# Altium footprint library Molex FFC - FPC Connectors (SMT).PcbLib: 638 footprints (part 19 of 40)
Each footprint in its own frame and in the unit in brackets; x right, y up, seen from the top. Pads: shape width x height; smd on the part's side, far side on the other; paste and mask are expansions set on the pad; w line width, h text height; cw(c..) or ccw(c..) is an arc to the next point about the centre after c.
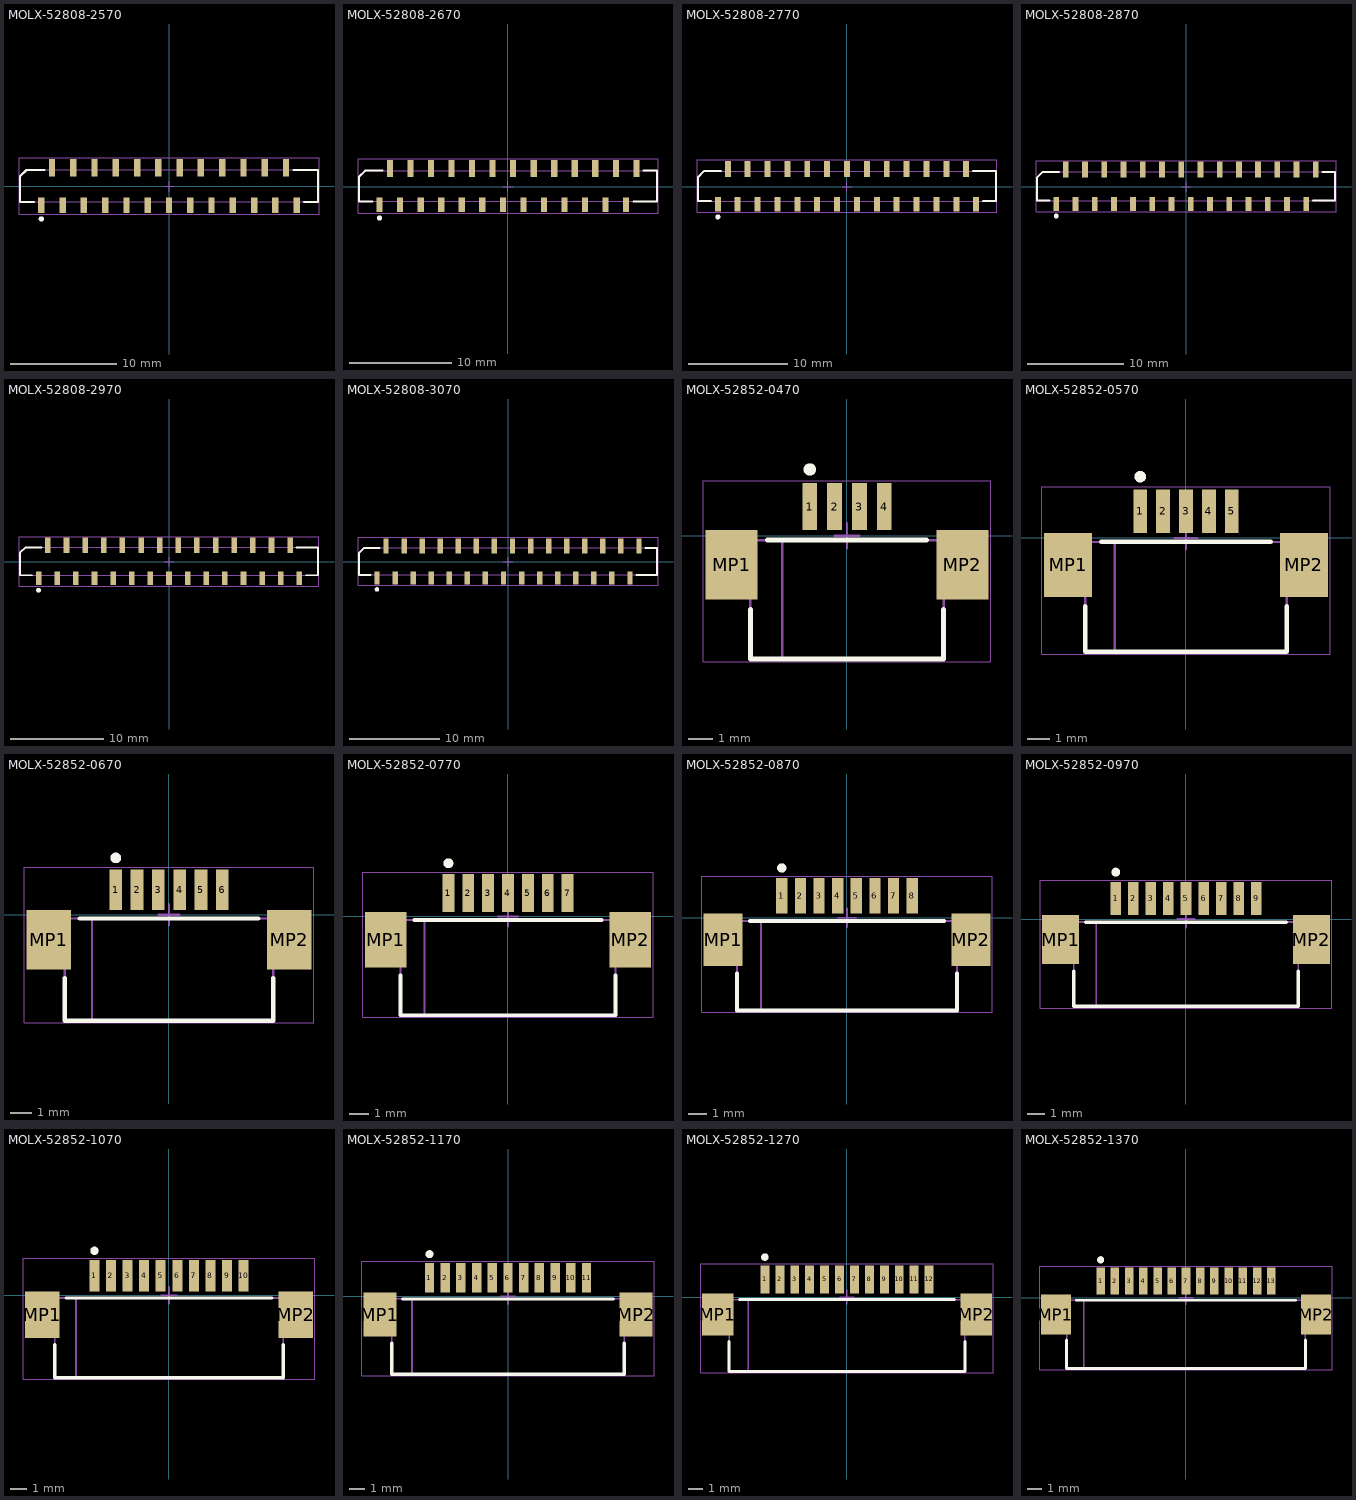
[diagram p18: the footprints below, top view; thin cyan lines are the x and y axes]

## MOLX-52808-2570 [mm] "FFC Connector, 25-Leads, Vertical, Pitch 1.0 mm, Mated Height 5.05 mm, SMT"
height 5.112
pads (25):
  rect 0.6x1.45 smd: 1(-12,-1.775) 3(-10,-1.775) 5(-8,-1.775) 7(-6,-1.775) 9(-4,-1.775) 11(-2,-1.775) 13(0,-1.775) 15(2,-1.775) 17(4,-1.775) 19(6,-1.775) 21(8,-1.775) 23(10,-1.775) 25(12,-1.775)
  rect 0.6x1.65 smd: 2(-11,1.775) 4(-9,1.775) 6(-7,1.775) 8(-5,1.775) 10(-3,1.775) 12(-1,1.775) 14(1,1.775) 16(3,1.775) 18(5,1.775) 20(7,1.775) 22(9,1.775) 24(11,1.775)
Top Overlay:
  circle w0.25: c-12,-3.05 r0.125
  lines w0.2: -12.7,-1.45 -14,-1.45 -14,0.95 -13.4,1.55 -11.7,1.55 ; 11.7,1.55 14,1.55 14,-1.45 12.7,-1.45
Mechanical 13:
  lines w0.1: -14,-1.45 14,-1.45 14,1.55 -13.4,1.55 -14,0.95 -14,-1.45
Mechanical 15:
  lines w0.05: -14.1,-2.6 14.1,-2.6 14.1,2.7 -14.1,2.7 -14.1,-2.6
  lines w0.1: -0.5,0 0.5,0 ; 0,-0.5 0,0.5
3D body: height 0.25, standoff 0, extent -14,-2.2 14,2.3

## MOLX-52808-2670 [mm] "FFC Connector, 26-Leads, Vertical, Pitch 1.0 mm, Mated Height 5.05 mm, SMT"
height 5.112
pads (26):
  rect 0.6x1.45 smd: 1(-12.5,-1.775) 3(-10.5,-1.775) 5(-8.5,-1.775) 7(-6.5,-1.775) 9(-4.5,-1.775) 11(-2.5,-1.775) 13(-0.5,-1.775) 15(1.5,-1.775) 17(3.5,-1.775) 19(5.5,-1.775) 21(7.5,-1.775) 23(9.5,-1.775) 25(11.5,-1.775)
  rect 0.6x1.65 smd: 2(-11.5,1.775) 4(-9.5,1.775) 6(-7.5,1.775) 8(-5.5,1.775) 10(-3.5,1.775) 12(-1.5,1.775) 14(0.5,1.775) 16(2.5,1.775) 18(4.5,1.775) 20(6.5,1.775) 22(8.5,1.775) 24(10.5,1.775) 26(12.5,1.775)
Top Overlay:
  circle w0.25: c-12.5,-3.05 r0.125
  lines w0.2: -13.2,-1.45 -14.5,-1.45 -14.5,0.95 -13.9,1.55 -12.2,1.55 ; 12.2,-1.45 14.5,-1.45 14.5,1.55 13.2,1.55
Mechanical 13:
  lines w0.1: -14.5,-1.45 14.5,-1.45 14.5,1.55 -13.9,1.55 -14.5,0.95 -14.5,-1.45
Mechanical 15:
  lines w0.05: -14.6,-2.6 14.6,-2.6 14.6,2.7 -14.6,2.7 -14.6,-2.6
  lines w0.1: -0.5,0 0.5,0 ; 0,-0.5 0,0.5
3D body: height 0.25, standoff 0, extent -14.5,-2.2 14.5,2.3

## MOLX-52808-2770 [mm] "FFC Connector, 27-Leads, Vertical, Pitch 1.0 mm, Mated Height 5.05 mm, SMT"
height 5.112
pads (27):
  rect 0.6x1.45 smd: 1(-13,-1.775) 3(-11,-1.775) 5(-9,-1.775) 7(-7,-1.775) 9(-5,-1.775) 11(-3,-1.775) 13(-1,-1.775) 15(1,-1.775) 17(3,-1.775) 19(5,-1.775) 21(7,-1.775) 23(9,-1.775) 25(11,-1.775) 27(13,-1.775)
  rect 0.6x1.65 smd: 2(-12,1.775) 4(-10,1.775) 6(-8,1.775) 8(-6,1.775) 10(-4,1.775) 12(-2,1.775) 14(0,1.775) 16(2,1.775) 18(4,1.775) 20(6,1.775) 22(8,1.775) 24(10,1.775) 26(12,1.775)
Top Overlay:
  circle w0.25: c-13,-3.05 r0.125
  lines w0.2: -13.7,-1.45 -15,-1.45 -15,0.95 -14.4,1.55 -12.7,1.55 ; 12.7,1.55 15,1.55 15,-1.45 13.7,-1.45
Mechanical 13:
  lines w0.1: -15,-1.45 15,-1.45 15,1.55 -14.4,1.55 -15,0.95 -15,-1.45
Mechanical 15:
  lines w0.05: -15.1,-2.6 15.1,-2.6 15.1,2.7 -15.1,2.7 -15.1,-2.6
  lines w0.1: -0.5,0 0.5,0 ; 0,-0.5 0,0.5
3D body: height 0.25, standoff 0, extent -15,-2.2 15,2.3

## MOLX-52808-2870 [mm] "FFC Connector, 28-Leads, Vertical, Pitch 1.0 mm, Mated Height 5.05 mm, SMT"
height 5.112
pads (28):
  rect 0.6x1.45 smd: 1(-13.5,-1.775) 3(-11.5,-1.775) 5(-9.5,-1.775) 7(-7.5,-1.775) 9(-5.5,-1.775) 11(-3.5,-1.775) 13(-1.5,-1.775) 15(0.5,-1.775) 17(2.5,-1.775) 19(4.5,-1.775) 21(6.5,-1.775) 23(8.5,-1.775) 25(10.5,-1.775) 27(12.5,-1.775)
  rect 0.6x1.65 smd: 2(-12.5,1.775) 4(-10.5,1.775) 6(-8.5,1.775) 8(-6.5,1.775) 10(-4.5,1.775) 12(-2.5,1.775) 14(-0.5,1.775) 16(1.5,1.775) 18(3.5,1.775) 20(5.5,1.775) 22(7.5,1.775) 24(9.5,1.775) 26(11.5,1.775) 28(13.5,1.775)
Top Overlay:
  circle w0.25: c-13.5,-3.05 r0.125
  lines w0.2: -14.2,-1.45 -15.5,-1.45 -15.5,0.95 -14.9,1.55 -13.2,1.55 ; 13.2,-1.45 15.5,-1.45 15.5,1.55 14.2,1.55
Mechanical 13:
  lines w0.1: -15.5,-1.45 15.5,-1.45 15.5,1.55 -14.9,1.55 -15.5,0.95 -15.5,-1.45
Mechanical 15:
  lines w0.05: -15.6,-2.6 15.6,-2.6 15.6,2.7 -15.6,2.7 -15.6,-2.6
  lines w0.1: -0.5,0 0.5,0 ; 0,-0.5 0,0.5
3D body: height 0.25, standoff 0, extent -15.5,-2.2 15.5,2.3

## MOLX-52808-2970 [mm] "FFC Connector, 29-Leads, Vertical, Pitch 1.0 mm, Mated Height 5.05 mm, SMT"
height 5.112
pads (29):
  rect 0.6x1.45 smd: 1(-14,-1.775) 3(-12,-1.775) 5(-10,-1.775) 7(-8,-1.775) 9(-6,-1.775) 11(-4,-1.775) 13(-2,-1.775) 15(0,-1.775) 17(2,-1.775) 19(4,-1.775) 21(6,-1.775) 23(8,-1.775) 25(10,-1.775) 27(12,-1.775) 29(14,-1.775)
  rect 0.6x1.65 smd: 2(-13,1.775) 4(-11,1.775) 6(-9,1.775) 8(-7,1.775) 10(-5,1.775) 12(-3,1.775) 14(-1,1.775) 16(1,1.775) 18(3,1.775) 20(5,1.775) 22(7,1.775) 24(9,1.775) 26(11,1.775) 28(13,1.775)
Top Overlay:
  circle w0.25: c-14,-3.05 r0.125
  lines w0.2: -14.7,-1.45 -16,-1.45 -16,0.95 -15.4,1.55 -13.7,1.55 ; 13.7,1.55 16,1.55 16,-1.45 14.7,-1.45
Mechanical 13:
  lines w0.1: -16,-1.45 16,-1.45 16,1.55 -15.4,1.55 -16,0.95 -16,-1.45
Mechanical 15:
  lines w0.05: -16.1,-2.6 16.1,-2.6 16.1,2.7 -16.1,2.7 -16.1,-2.6
  lines w0.1: -0.5,0 0.5,0 ; 0,-0.5 0,0.5
3D body: height 0.25, standoff 0, extent -16,-2.2 16,2.3

## MOLX-52808-3070 [mm] "FFC Connector, 30-Leads, Vertical, Pitch 1.0 mm, Mated Height 5.05 mm, SMT"
height 5.112
pads (30):
  rect 0.6x1.45 smd: 1(-14.5,-1.775) 3(-12.5,-1.775) 5(-10.5,-1.775) 7(-8.5,-1.775) 9(-6.5,-1.775) 11(-4.5,-1.775) 13(-2.5,-1.775) 15(-0.5,-1.775) 17(1.5,-1.775) 19(3.5,-1.775) 21(5.5,-1.775) 23(7.5,-1.775) 25(9.5,-1.775) 27(11.5,-1.775) 29(13.5,-1.775)
  rect 0.6x1.65 smd: 2(-13.5,1.775) 4(-11.5,1.775) 6(-9.5,1.775) 8(-7.5,1.775) 10(-5.5,1.775) 12(-3.5,1.775) 14(-1.5,1.775) 16(0.5,1.775) 18(2.5,1.775) 20(4.5,1.775) 22(6.5,1.775) 24(8.5,1.775) 26(10.5,1.775) 28(12.5,1.775) 30(14.5,1.775)
Top Overlay:
  circle w0.25: c-14.5,-3.05 r0.125
  lines w0.2: -15.2,-1.45 -16.5,-1.45 -16.5,0.95 -15.9,1.55 -14.2,1.55 ; 14.2,-1.45 16.5,-1.45 16.5,1.55 15.2,1.55
Mechanical 13:
  lines w0.1: -16.5,-1.45 16.5,-1.45 16.5,1.55 -15.9,1.55 -16.5,0.95 -16.5,-1.45
Mechanical 15:
  lines w0.05: -16.6,-2.6 16.6,-2.6 16.6,2.7 -16.6,2.7 -16.6,-2.6
  lines w0.1: -0.5,0 0.5,0 ; 0,-0.5 0,0.5
3D body: height 0.25, standoff 0, extent -16.5,-2.2 16.5,2.3

## MOLX-52852-0470 [mm] "FFC Connector, 4-Leads, Right Angle, Pitch 1.0 mm, Mated Height 3.1 mm, SMT"
height 3.1
pads (6):
  rect 0.6x1.9 smd: 1(-1.5,1.175) 2(-0.5,1.175) 3(0.5,1.175) 4(1.5,1.175)
  rect 2.1x2.8 smd: MP1(-4.65,-1.175) MP2(4.65,-1.175)
Top Overlay:
  circle w0.25: c-1.5,2.675 r0.125
  lines w0.2: -3.9,-2.975 -3.9,-4.975 3.9,-4.975 3.9,-2.975 ; -3.2,-0.175 3.2,-0.175
Mechanical 13:
  lines w0.1: -2.614,-4.975 -2.614,-0.175 ; -3.9,-4.975 -3.9,-0.175 3.9,-0.175 3.9,-4.975 -3.9,-4.975
Mechanical 15:
  lines w0.05: -5.8,-5.075 -5.8,2.225 5.8,2.225 5.8,-5.075 -5.8,-5.075
  lines w0.1: -0.5,0 0.5,0 ; 0,-0.5 0,0.5
3D body: height 0.25, standoff 0, extent -5.15,-4.975 5.15,1.825

## MOLX-52852-0570 [mm] "FFC Connector, 5-Leads, Right Angle, Pitch 1.0 mm, Mated Height 3.1 mm, SMT"
height 3.1
pads (7):
  rect 0.6x1.9 smd: 1(-2,1.175) 2(-1,1.175) 3(0,1.175) 4(1,1.175) 5(2,1.175)
  rect 2.1x2.8 smd: MP1(-5.15,-1.175) MP2(5.15,-1.175)
Top Overlay:
  circle w0.25: c-2,2.675 r0.125
  lines w0.2: -4.4,-2.975 -4.4,-4.975 4.4,-4.975 4.4,-2.975 ; -3.7,-0.175 3.7,-0.175
Mechanical 13:
  lines w0.1: -3.114,-4.975 -3.114,-0.175 ; -4.4,-4.975 4.4,-4.975 4.4,-0.175 -4.4,-0.175 -4.4,-4.975
Mechanical 15:
  lines w0.05: -6.3,-5.075 6.3,-5.075 6.3,2.225 -6.3,2.225 -6.3,-5.075
  lines w0.1: -0.5,0 0.5,0 ; 0,-0.5 0,0.5
3D body: height 0.25, standoff 0, extent -5.65,-4.975 5.65,1.825

## MOLX-52852-0670 [mm] "FFC Connector, 6-Leads, Right Angle, Pitch 1.0 mm, Mated Height 3.1 mm, SMT"
height 3.1
pads (8):
  rect 0.6x1.9 smd: 1(-2.5,1.175) 2(-1.5,1.175) 3(-0.5,1.175) 4(0.5,1.175) 5(1.5,1.175) 6(2.5,1.175)
  rect 2.1x2.8 smd: MP1(-5.65,-1.175) MP2(5.65,-1.175)
Top Overlay:
  circle w0.25: c-2.5,2.675 r0.125
  lines w0.2: -4.9,-2.975 -4.9,-4.975 4.9,-4.975 4.9,-2.975 ; -4.2,-0.175 4.2,-0.175
Mechanical 13:
  lines w0.1: -3.614,-4.975 -3.614,-0.175 ; -4.9,-4.975 4.9,-4.975 4.9,-0.175 -4.9,-0.175 -4.9,-4.975
Mechanical 15:
  lines w0.05: -6.8,-5.075 6.8,-5.075 6.8,2.225 -6.8,2.225 -6.8,-5.075
  lines w0.1: -0.5,0 0.5,0 ; 0,-0.5 0,0.5
3D body: height 0.25, standoff 0, extent -6.15,-4.975 6.15,1.825

## MOLX-52852-0770 [mm] "FFC Connector, 7-Leads, Right Angle, Pitch 1.0 mm, Mated Height 3.1 mm, SMT"
height 3.1
pads (9):
  rect 0.6x1.9 smd: 1(-3,1.175) 2(-2,1.175) 3(-1,1.175) 4(0,1.175) 5(1,1.175) 6(2,1.175) 7(3,1.175)
  rect 2.1x2.8 smd: MP1(-6.15,-1.175) MP2(6.15,-1.175)
Top Overlay:
  circle w0.25: c-3,2.675 r0.125
  lines w0.2: -5.4,-2.975 -5.4,-4.975 5.4,-4.975 5.4,-2.975 ; -4.7,-0.175 4.7,-0.175
Mechanical 13:
  lines w0.1: -4.2,-4.975 -4.2,-0.175 ; -5.4,-4.975 5.4,-4.975 5.4,-0.175 -5.4,-0.175 -5.4,-4.975
Mechanical 15:
  lines w0.05: -7.3,-5.075 7.3,-5.075 7.3,2.225 -7.3,2.225 -7.3,-5.075
  lines w0.1: -0.5,0 0.5,0 ; 0,-0.5 0,0.5
3D body: height 0.25, standoff 0, extent -6.65,-4.975 6.65,1.825

## MOLX-52852-0870 [mm] "FFC Connector, 8-Leads, Right Angle, Pitch 1.0 mm, Mated Height 3.1 mm, SMT"
height 3.1
pads (10):
  rect 0.6x1.9 smd: 1(-3.5,1.175) 2(-2.5,1.175) 3(-1.5,1.175) 4(-0.5,1.175) 5(0.5,1.175) 6(1.5,1.175) 7(2.5,1.175) 8(3.5,1.175)
  rect 2.1x2.8 smd: MP1(-6.65,-1.175) MP2(6.65,-1.175)
Top Overlay:
  circle w0.25: c-3.5,2.675 r0.125
  lines w0.2: -5.9,-2.975 -5.9,-4.975 5.9,-4.975 5.9,-2.975 ; -5.2,-0.175 5.2,-0.175
Mechanical 13:
  lines w0.1: -4.614,-4.975 -4.614,-0.175 ; -5.9,-4.975 -5.9,-0.175 5.9,-0.175 5.9,-4.975 -5.9,-4.975
Mechanical 15:
  lines w0.05: -7.8,-5.075 -7.8,2.225 7.8,2.225 7.8,-5.075 -7.8,-5.075
  lines w0.1: -0.5,0 0.5,0 ; 0,-0.5 0,0.5
3D body: height 0.25, standoff 0, extent -7.15,-4.975 7.15,1.825

## MOLX-52852-0970 [mm] "FFC Connector, 9-Leads, Right Angle, Pitch 1.0 mm, Mated Height 3.1 mm, SMT"
height 3.1
pads (11):
  rect 0.6x1.9 smd: 1(-4,1.175) 2(-3,1.175) 3(-2,1.175) 4(-1,1.175) 5(0,1.175) 6(1,1.175) 7(2,1.175) 8(3,1.175) 9(4,1.175)
  rect 2.1x2.8 smd: MP1(-7.15,-1.175) MP2(7.15,-1.175)
Top Overlay:
  circle w0.25: c-4,2.675 r0.125
  lines w0.2: -6.4,-2.975 -6.4,-4.975 6.4,-4.975 6.4,-2.975 ; -5.7,-0.175 5.7,-0.175
Mechanical 13:
  lines w0.1: -5.114,-4.975 -5.114,-0.175 ; -6.4,-4.975 -6.4,-0.175 6.4,-0.175 6.4,-4.975 -6.4,-4.975
Mechanical 15:
  lines w0.05: -8.3,-5.075 -8.3,2.225 8.3,2.225 8.3,-5.075 -8.3,-5.075
  lines w0.1: -0.5,0 0.5,0 ; 0,-0.5 0,0.5
3D body: height 0.25, standoff 0, extent -7.65,-4.975 7.65,1.825

## MOLX-52852-1070 [mm] "FFC Connector, 10-Leads, Right Angle, Pitch 1.0 mm, Mated Height 3.1 mm, SMT"
height 3.1
pads (12):
  rect 0.6x1.9 smd: 1(-4.5,1.175) 2(-3.5,1.175) 3(-2.5,1.175) 4(-1.5,1.175) 5(-0.5,1.175) 6(0.5,1.175) 7(1.5,1.175) 8(2.5,1.175) 9(3.5,1.175) 10(4.5,1.175)
  rect 2.1x2.8 smd: MP1(-7.65,-1.175) MP2(7.65,-1.175)
Top Overlay:
  circle w0.25: c-4.5,2.675 r0.125
  lines w0.2: -6.9,-2.975 -6.9,-4.975 6.9,-4.975 6.9,-2.975 ; -6.2,-0.175 6.2,-0.175
Mechanical 13:
  lines w0.1: -5.614,-4.975 -5.614,-0.175 ; -6.9,-4.975 6.9,-4.975 6.9,-0.175 -6.9,-0.175 -6.9,-4.975
Mechanical 15:
  lines w0.05: -8.8,-5.075 8.8,-5.075 8.8,2.225 -8.8,2.225 -8.8,-5.075
  lines w0.1: -0.5,0 0.5,0 ; 0,-0.5 0,0.5
3D body: height 0.25, standoff 0, extent -8.15,-4.975 8.15,1.825

## MOLX-52852-1170 [mm] "FFC Connector, 11-Leads, Right Angle, Pitch 1.0 mm, Mated Height 3.1 mm, SMT"
height 3.1
pads (13):
  rect 0.6x1.9 smd: 1(-5,1.175) 2(-4,1.175) 3(-3,1.175) 4(-2,1.175) 5(-1,1.175) 6(0,1.175) 7(1,1.175) 8(2,1.175) 9(3,1.175) 10(4,1.175) 11(5,1.175)
  rect 2.1x2.8 smd: MP1(-8.15,-1.175) MP2(8.15,-1.175)
Top Overlay:
  circle w0.25: c-5,2.675 r0.125
  lines w0.2: -7.4,-2.975 -7.4,-4.975 7.4,-4.975 7.4,-2.975 ; -6.7,-0.175 6.7,-0.175
Mechanical 13:
  lines w0.1: -6.114,-4.975 -6.114,-0.175 ; -7.4,-4.975 7.4,-4.975 7.4,-0.175 -7.4,-0.175 -7.4,-4.975
Mechanical 15:
  lines w0.05: -9.3,-5.075 9.3,-5.075 9.3,2.225 -9.3,2.225 -9.3,-5.075
  lines w0.1: -0.5,0 0.5,0 ; 0,-0.5 0,0.5
3D body: height 0.25, standoff 0, extent -8.65,-4.975 8.65,1.825

## MOLX-52852-1270 [mm] "FFC Connector, 12-Leads, Right Angle, Pitch 1.0 mm, Mated Height 3.1 mm, SMT"
height 3.1
pads (14):
  rect 0.6x1.9 smd: 1(-5.5,1.175) 2(-4.5,1.175) 3(-3.5,1.175) 4(-2.5,1.175) 5(-1.5,1.175) 6(-0.5,1.175) 7(0.5,1.175) 8(1.5,1.175) 9(2.5,1.175) 10(3.5,1.175) 11(4.5,1.175) 12(5.5,1.175)
  rect 2.1x2.8 smd: MP1(-8.65,-1.175) MP2(8.65,-1.175)
Top Overlay:
  circle w0.25: c-5.5,2.675 r0.125
  lines w0.2: -7.9,-2.975 -7.9,-4.975 7.9,-4.975 7.9,-2.975 ; -7.2,-0.175 7.2,-0.175
Mechanical 13:
  lines w0.1: -6.614,-4.975 -6.614,-0.175 ; -7.9,-4.975 -7.9,-0.175 7.9,-0.175 7.9,-4.975 -7.9,-4.975
Mechanical 15:
  lines w0.05: -9.8,-5.075 -9.8,2.225 9.8,2.225 9.8,-5.075 -9.8,-5.075
  lines w0.1: -0.5,0 0.5,0 ; 0,-0.5 0,0.5
3D body: height 0.25, standoff 0, extent -9.15,-4.975 9.15,1.825

## MOLX-52852-1370 [mm] "FFC Connector, 13-Leads, Right Angle, Pitch 1.0 mm, Mated Height 3.1 mm, SMT"
height 3.1
pads (15):
  rect 0.6x1.9 smd: 1(-6,1.175) 2(-5,1.175) 3(-4,1.175) 4(-3,1.175) 5(-2,1.175) 6(-1,1.175) 7(0,1.175) 8(1,1.175) 9(2,1.175) 10(3,1.175) 11(4,1.175) 12(5,1.175) 13(6,1.175)
  rect 2.1x2.8 smd: MP1(-9.15,-1.175) MP2(9.15,-1.175)
Top Overlay:
  circle w0.25: c-6,2.675 r0.125
  lines w0.2: -8.4,-2.975 -8.4,-4.975 8.4,-4.975 8.4,-2.975 ; -7.7,-0.175 7.7,-0.175
Mechanical 13:
  lines w0.1: -7.2,-4.975 -7.2,-0.175 ; -8.4,-4.975 -8.4,-0.175 8.4,-0.175 8.4,-4.975 -8.4,-4.975
Mechanical 15:
  lines w0.05: -10.3,-5.075 -10.3,2.225 10.3,2.225 10.3,-5.075 -10.3,-5.075
  lines w0.1: -0.5,0 0.5,0 ; 0,-0.5 0,0.5
3D body: height 0.25, standoff 0, extent -9.65,-4.975 9.65,1.825